# Altium footprint library 常用原件库.PcbLib: 163 footprints (part 9 of 11)
Each footprint in its own frame and in the unit in brackets; x right, y up, seen from the top. Pads: shape width x height; smd on the part's side, far side on the other; paste and mask are expansions set on the pad; w line width, h text height; cw(c..) or ccw(c..) is an arc to the next point about the centre after c.
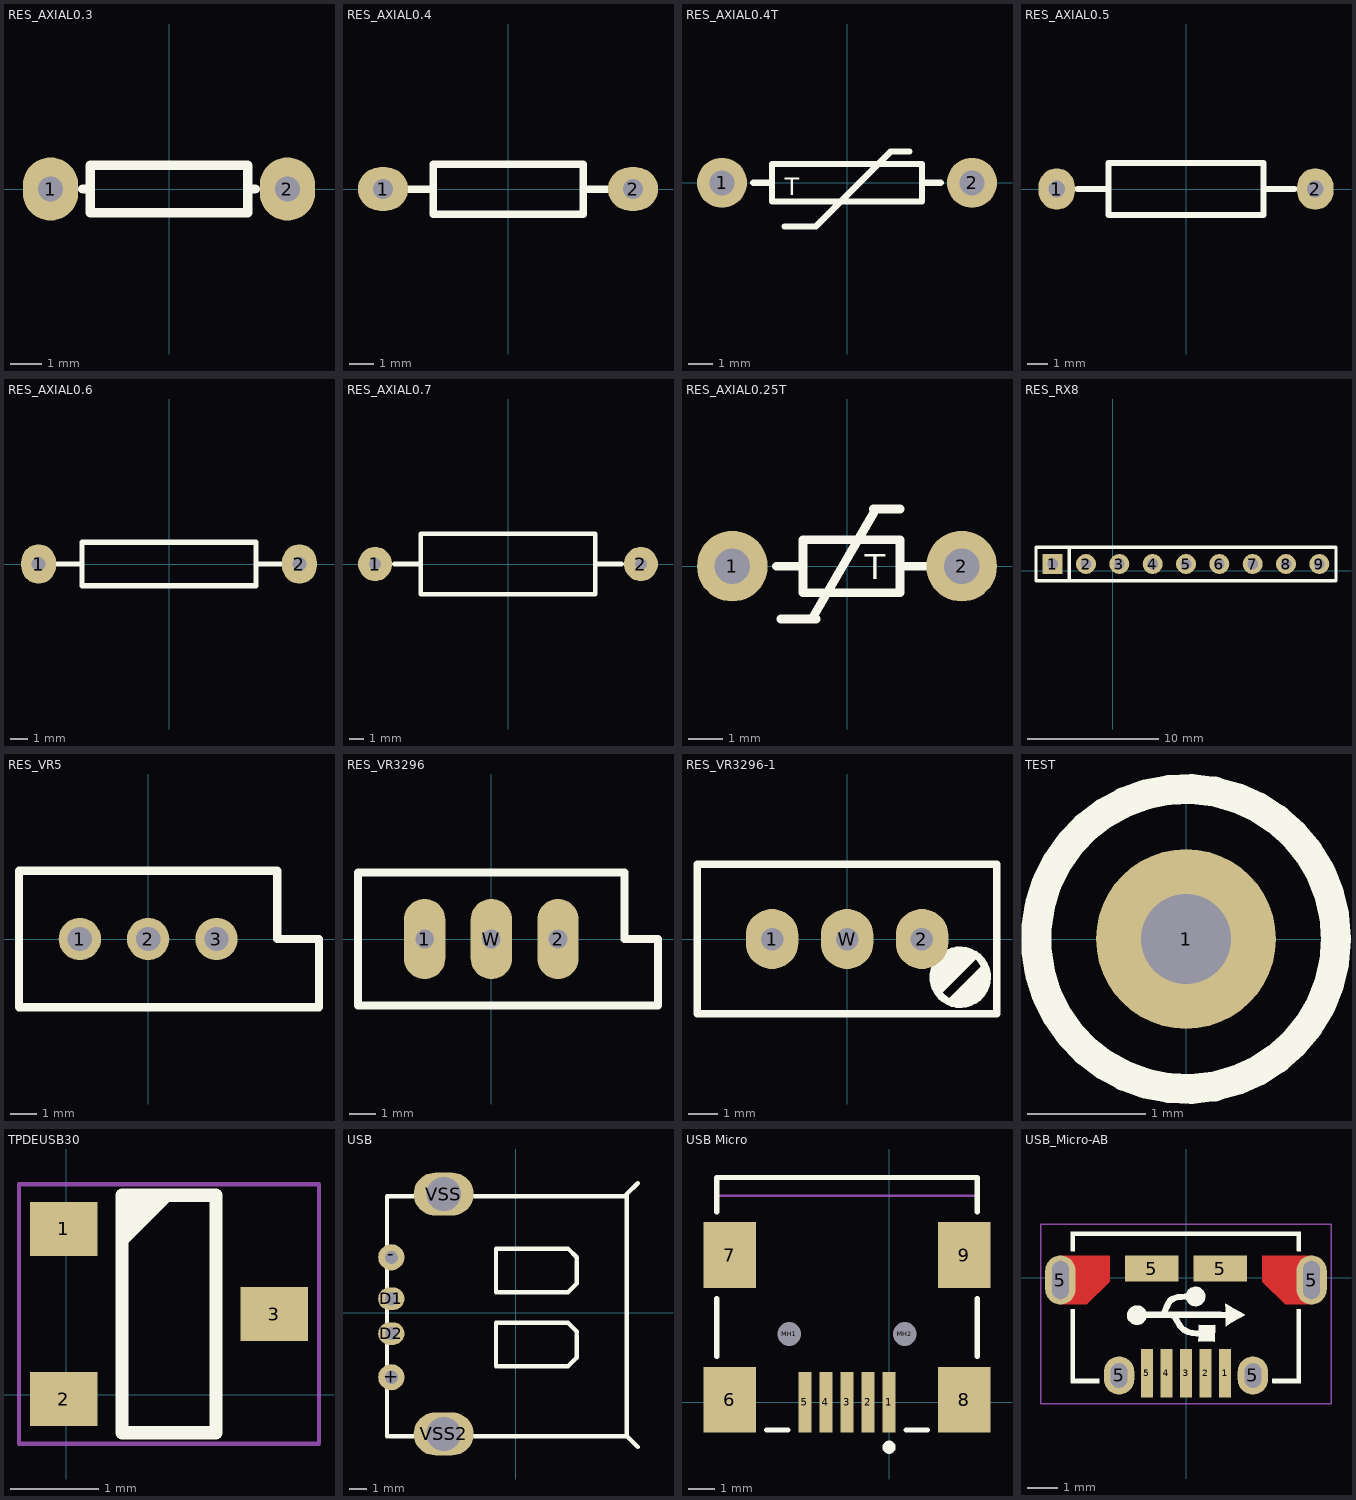
[diagram p8: the footprints below, top view; thin cyan lines are the x and y axes]

## RES_AXIAL0.3 [mil]
pads (2):
  oval 70x80 hole 32: 1(-150,0) 2(150,0)
Top Overlay:
  lines w12: -109,0 -100,0 ; 109,0 100,0 ; 100,0 100,30 -100,30 -100,-30 100,-30 100,0

## RES_AXIAL0.4 [mil]
pads (2):
  oval 80x70 hole 32: 1(-200,0) 2(200,0)
Top Overlay:
  lines w12: -160,0 -120,0 ; 120,0 160,0 ; -120,-40 120,-40 120,40 -120,40 -120,-40

## RES_AXIAL0.4T [mil]
pads (2):
  round 80 hole 40: 1(-200,0) 2(200,0)
Top Overlay:
  lines w10: -150,0 -120,0 ; -100,-70 -50,-70 70,50 100,50 ; 120,0 150,0 ; -120,-30 120,-30 120,30 -120,30 -120,-30
  text "T" at -100,-20 h28

## RES_AXIAL0.5 [mil]
pads (2):
  oval 70x80 hole 32: 1(-250,0) 2(250,0)
Top Overlay:
  lines w12: -210,0 -150,0 ; 150,0 210,0 ; -150,-50 150,-50 150,50 -150,50 -150,-50

## RES_AXIAL0.6 [mil]
pads (2):
  oval 80x90 hole 32: 1(-300,0) 2(300,0)
Top Overlay:
  lines w12: -260,0 -200,0 ; 200,0 260,0 ; -200,-50 -200,50 200,50 200,-50 -200,-50

## RES_AXIAL0.7 [mil]
pads (2):
  round 90 hole 32: 1(-350,0) 2(350,0)
Top Overlay:
  lines w12: -300,0 -230,0 ; 230,0 300,0 ; -230,-80 230,-80 230,80 -230,80 -230,-80

## RES_AXIAL0.25T [mil]
pads (2):
  round 80 hole 40: 1(-130,0) 2(130,0)
Top Overlay:
  lines w10: -80,0 -50,0 ; -75,-60 -35,-60 ; -40,-60 30,60 ; 30,65 60,65 ; 60,0 90,0 ; -50,-30 -50,30 60,30 60,-30 -50,-30
  text "T" at 20,-15 h28

## RES_RX8 [mil]
pads (9):
  rect 60x60 hole 32: 1(-180,20)
  round 60 hole 32: 2(-80,20) 3(20,20) 4(120,20) 5(220,20) 6(320,20) 7(420,20) 8(520,20) 9(620,20)
Top Overlay:
  lines w10: -130,-30 -130,70 ; -230,-30 -230,70 670,70 670,-30 -230,-30

## RES_VR5 [mil]
pads (3):
  round 62 hole 35.43: 1(-100,0) 2(0,0) 3(100,0)
Top Overlay:
  lines w12: -188.98,-100 250,-100 250,0 188.98,0 188.98,100 -188.98,100 -188.98,-100

## RES_VR3296 [mil]
pads (3):
  oval 62x120 hole 28: 1(-100,0) 2(100,0) W(0,0)
Top Overlay:
  lines w12: -200,-100 250,-100 250,0 200,0 200,100 -200,100 -200,-100

## RES_VR3296-1 [mil]
pads (3):
  oval 70x80 hole 30: 1(-100,0) 2(100,0) W(0,0)
Top Overlay:
  circle w10: c151,-51 r36.06
  lines w10: 157.76,-74.24 164.24,-74.24 171,-81 ; 171,-21 151,-41 121,-71 121,-61 161,-21 141,-21 ; 172.88,-79.12 171,-81 ; 181,-41 141,-81 151,-81 ; 131,-31 141,-31 ; 131,-31 141,-21 ; 131,-31 121,-41 121,-51 141,-31 ; 141,-31 151,-31 141,-21 ; 141,-31 141,-21 ; 151,-81 166.82,-65.18 172.88,-65.18 187.06,-51 187.06,-47.06 172.88,-61.23 170.77,-61.23 171,-61.47 171,-81 ; 151,-81 171,-81 ; -200,-100 -200,100 200,100 200,-100 0,-100 -200,-100

## TEST [mil] "TEST Pad"
pads (1):
  round 60 hole 30: 1(0,0)
Top Overlay:
  circle w10: c0,0 r50

## TPDEUSB30 [mil] "TPDEUSB30"
pads (3):
  rect 30x24 smd: 1(-1,74) 2(-1,-2) 3(93,36)
Top Overlay:
  region: 25,89 49,89 25,65
  lines w6: 25,-17 67,-17 67,89 25,89 25,-17
Mechanical 14:
  lines w2: -21,-22 113,-22 113,94 -21,94 -21,-22
3D body: height 51.18, standoff 0, extent -9.11,-21.09 101.12,93.09

## USB [mm]
pads (6):
  round 1.524 hole 0.762: +(-7.255,-3.757) -(-7.255,3.228)
  oval 1.524x1.324 hole 0.762: D1(-7.255,0.815) D2(-7.255,-1.217)
  oval 3.5x2.5 hole 2: VSS(-4.207,6.911) VSS2(-4.207,-7.059)
Top Overlay:
  lines w0.254: -7.509,-7.186 -7.509,6.784 6.461,6.784 ; -7.382,-7.186 6.461,-7.186 ; -1.159,-3.122 -1.159,-0.582 3.032,-0.582 3.54,-1.09 3.54,-1.217 ; -1.159,1.196 -1.159,3.736 3.032,3.736 3.54,3.228 3.54,3.101 ; -1.032,-3.122 3.032,-3.122 3.54,-2.614 3.54,-1.344 ; -1.032,1.196 3.032,1.196 3.54,1.704 3.54,2.974 ; 7.096,-7.821 6.461,-7.186 ; 7.096,7.546 6.461,6.911 6.461,6.784 ; 6.461,-7.186 6.461,6.784

## USB Micro [mm] "Micro USB 5p"
pads (11):
  rect 0.5x2.3 smd: 1(0,0) 2(-0.8,0) 3(-1.6,0) 4(-2.4,0) 5(-3.2,0)
  rect 2x2.5 smd: 6(-6.05,0.1) 7(-6.05,5.6) 8(2.85,0.1) 9(2.85,5.6)
  round 0.6 hole 0.9 unplated: MH1(-3.8,2.6) MH2(0.6,2.6)
Top Overlay:
  circle w0.25: c0,-1.7 r0.125
  lines w0.2: -6.55,1.75 -6.55,3.95 ; -6.55,7.25 -6.55,8.55 3.35,8.55 3.35,7.25 ; -4.65,-1.05 -3.85,-1.05 ; 0.65,-1.05 1.45,-1.05 ; 3.35,1.75 3.35,3.95
Mechanical 1:
  lines w0.1: -6.55,7.85 3.35,7.85
  text "PCB Edge" at 2.436,8.282 h0.25

## USB_Micro-AB [mil]
height 153.54
pads (11):
  rect 15.75x64 smd: 1(51.18,-125) 2(25.59,-125) 3(0,-125) 4(-25.59,-125) 5(-51.18,-125)
  oval 40x64 hole 22 slot 50 at 90 deg mask+0: 5(-164.37,-3) 5(164.37,-3)
  oval 40x50 hole 22 slot 32 at 90 deg mask+0: 5(-87.6,-128) 5(87.6,-128)
  rect 70x34 smd mask+0: 5(-45,12) 5(45,12)
Top Layer:
  region: -164.37,29 -100,29 -100,-5 -130,-35 -164.37,-35
  region: 100,29 164.37,29 164.37,-35 130,-35 100,-5
Top Overlay:
  drawing of 24 lines, arcs and shapes, not listed
Top Solder:
  region: -164.37,29 -100,29 -100,-5 -130,-35 -164.37,-35
  region: 100,29 164.37,29 164.37,-35 130,-35 100,-5
Mechanical 14:
  lines w2: -190,-165 -190,70 190,70 190,-165 -190,-165
3D body: height 106.7, standoff -9.04, extent -157.09,-141.34 157.08,72.44